# Altium integrated library WE_WR-TBL_Wire Protector System_5.00 mm_rev15e.IntLib: 76 symbols
Pins are listed as number, name and electrical type; pins without a type are passive.

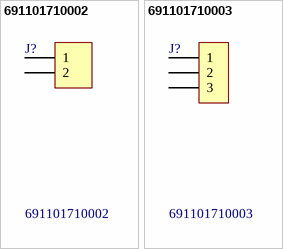
[diagram p0: symbols 691101710002 to 691101710003]

## 691101710002
designator J?
WR-TBL Terminal block - serie 101-5.0mm; Manufacturer: Würth Elektronik eiSos GmbH; ComponentLink1 Description: Manufacturer; ComponentLink2 Description: Datasheet; NoPins: 2; Created Date: 30 October 2013; partNo: 691101710002; ComponentLink1URL: http://www.we-online.com; ComponentLink2URL: http://katalog.we-online.de/em/datasheet/6911017100xx.pdf; Created by: Karrer Zheng
footprint 691101710002 (5,00mm - modular - blue - Horizontal entry with pressure clamp - 12,6mm height - 02p)
pins: 1, 2

## 691101710003
designator J?
WR-TBL Terminal block - serie 101-5.0mm; Manufacturer: Würth Elektronik eiSos GmbH; ComponentLink1 Description: Manufacturer; ComponentLink2 Description: Datasheet; NoPins: 3; Created Date: 30 October 2013; partNo: 691101710003; ComponentLink1URL: http://www.we-online.com; ComponentLink2URL: http://katalog.we-online.de/em/datasheet/6911017100xx.pdf; Created by: Karrer Zheng
footprint 691101710003 (5,00mm - modular - blue - Horizontal entry with pressure clamp - 12,6mm height - 03p)
pins: 1, 2, 3


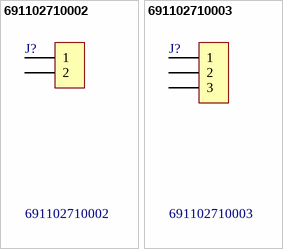
[diagram p1: symbols 691102710002 to 691102710003]

## 691102710002
designator J?
WR-TBL Terminal block - serie 102 - 5.0mm; Manufacturer: Würth Elektronik eiSos GmbH; ComponentLink1 Description: Manufacturer; ComponentLink2 Description: Datasheet; NoPins: 2; Created Date: 31 October 2013; partNo: 691102710002; ComponentLink1URL: http://www.we-online.com; ComponentLink2URL: http://katalog.we-online.de/em/datasheet/6911027100xx.pdf; Created by: Karrer Zheng
footprint 691102710002 (5,00mm - modular - blue - Horizontal entry with pressure clamp - 9,9 mm height - 02p)
pins: 1, 2

## 691102710003
designator J?
WR-TBL Terminal block - serie 102 - 5.0mm; Manufacturer: Würth Elektronik eiSos GmbH; ComponentLink1 Description: Manufacturer; ComponentLink2 Description: Datasheet; NoPins: 3; Created Date: 31 October 2013; partNo: 691102710003; ComponentLink1URL: http://www.we-online.com; ComponentLink2URL: http://katalog.we-online.de/em/datasheet/6911027100xx.pdf; Created by: Karrer Zheng
footprint 691102710003 (5,00mm - modular - blue - Horizontal entry with pressure clamp - 9,9 mm height - 03p)
pins: 1, 2, 3


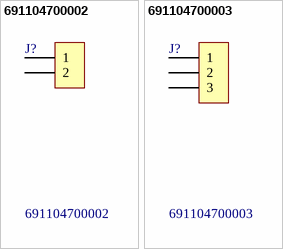
[diagram p2: symbols 691104700002 to 691104700003]

## 691104700002
designator J?
WR-TBL Terminal block - serie 1047 - 5.0mm; Manufacturer: Würth Elektronik eiSos GmbH; ComponentLink1 Description: Manufacturer; ComponentLink2 Description: Datasheet; NoPins: 2; Created Date: 1 Novenber 2013; partNo: 691104700002; ComponentLink1URL: http://www.we-online.com; ComponentLink2URL: http://katalog.we-online.de/em/datasheet/66911047000xx.pdf; Created by: Karrer Zheng
footprint 691104700002 (,00mm - modular - blue - Vertical wire entry - Pressure clamp - 02p)
pins: 1, 2

## 691104700003
designator J?
WR-TBL Terminal block - serie 1047 - 5.0mm; Manufacturer: Würth Elektronik eiSos GmbH; ComponentLink1 Description: Manufacturer; ComponentLink2 Description: Datasheet; NoPins: 3; Created Date: 1 Novenber 2013; partNo: 691104700003; ComponentLink1URL: http://www.we-online.com; ComponentLink2URL: http://katalog.we-online.de/em/datasheet/66911047000xx.pdf; Created by: Karrer Zheng
footprint 691104700003 (,00mm - modular - blue - Vertical wire entry - Pressure clamp - 03p)
pins: 1, 2, 3


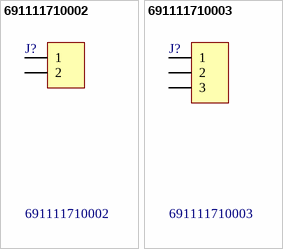
[diagram p3: symbols 691111710002 to 691111710003]

## 691111710002
designator J?
WR-TBL Terminal block - serie 111 - 5.0mm; Manufacturer: Würth Elektronik eiSos GmbH; ComponentLink1 Description: Manufacturer; ComponentLink2 Description: Datasheet; NoPins: 2; Created Date: 6 Novenber 2013; partNo: 691111710002; ComponentLink1URL: http://www.we-online.com; ComponentLink2URL: http://katalog.we-online.de/em/datasheet/6911117100xx.pdf; Created by: Karrer Zheng
footprint 691111710002 (5,00mm - modular - green - Horizontal entry with pressure clamp - 10,0mm height - 02p)
pins: 1, 2

## 691111710003
designator J?
WR-TBL Terminal block - serie 111 - 5.0mm; Manufacturer: Würth Elektronik eiSos GmbH; ComponentLink1 Description: Manufacturer; ComponentLink2 Description: Datasheet; NoPins: 3; Created Date: 6 Novenber 2013; partNo: 691111710003; ComponentLink1URL: http://www.we-online.com; ComponentLink2URL: http://katalog.we-online.de/em/datasheet/6911117100xx.pdf; Created by: Karrer Zheng
footprint 691111710003 (5,00mm - modular - green - Horizontal entry with pressure clamp - 10,0mm height - 03p)
pins: 1, 2, 3


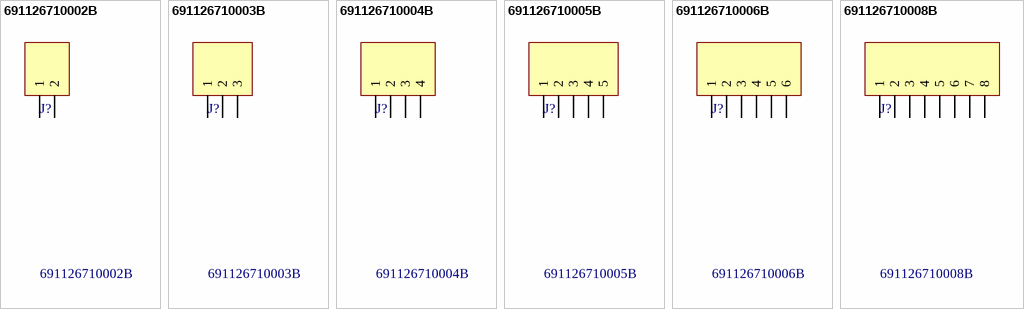
[diagram p4: symbols 691126710002B to 691126710008B]

## 691126710002B
designator J?
WR-TBL Terminal Block - Serie 126B - 5.0mm; Manufacturer: Würth Elektronik eiSos GmbH; ComponentLink1 Description: Manufacturer; ComponentLink2 Description: Datasheet; NoPins: 2; Created Date: 1 Novenber 2013; partNo: 691126710002B; ComponentLink1URL: http://www.we-online.com; ComponentLink2URL: http://katalog.we-online.de/em/datasheet/6911267100xxB.pdf; Created by: Karrer Zheng
footprint 691126710002B (5,00 mm - PCB Horizontal - 02p)
pins: 1, 2

## 691126710003B
designator J?
WR-TBL Terminal Block - Serie 126B - 5.0mm; Manufacturer: Würth Elektronik eiSos GmbH; ComponentLink1 Description: Manufacturer; ComponentLink2 Description: Datasheet; NoPins: 3; Created Date: 1 Novenber 2013; partNo: 691126710003B; ComponentLink1URL: http://www.we-online.com; ComponentLink2URL: http://katalog.we-online.de/em/datasheet/6911267100xxB.pdf; Created by: Karrer Zheng
footprint 691126710003B (5,00 mm - PCB Horizontal - 03p)
pins: 1, 2, 3

## 691126710004B
designator J?
WR-TBL Terminal Block - Serie 126B - 5.0mm; Manufacturer: Würth Elektronik eiSos GmbH; ComponentLink1 Description: Manufacturer; ComponentLink2 Description: Datasheet; NoPins: 4; Created Date: 1 Novenber 2013; partNo: 691126710004B; ComponentLink1URL: http://www.we-online.com; ComponentLink2URL: http://katalog.we-online.de/em/datasheet/6911267100xxB.pdf; Created by: Karrer Zheng
footprint 691126710004B (5,00 mm - PCB Horizontal - 04p)
pins: 1, 2, 3, 4

## 691126710005B
designator J?
WR-TBL Terminal Block - Serie 126B - 5.0mm; Manufacturer: Würth Elektronik eiSos GmbH; ComponentLink1 Description: Manufacturer; ComponentLink2 Description: Datasheet; NoPins: 5; Created Date: 1 Novenber 2013; partNo: 691126710005B; ComponentLink1URL: http://www.we-online.com; ComponentLink2URL: http://katalog.we-online.de/em/datasheet/6911267100xxB.pdf; Created by: Karrer Zheng
footprint 691126710005B (5,00 mm - PCB Horizontal - 05p)
pins: 1, 2, 3, 4, 5

## 691126710006B
designator J?
WR-TBL Terminal Block - Serie 126B - 5.0mm; Manufacturer: Würth Elektronik eiSos GmbH; ComponentLink1 Description: Manufacturer; ComponentLink2 Description: Datasheet; NoPins: 6; Created Date: 1 Novenber 2013; partNo: 691126710006B; ComponentLink1URL: http://www.we-online.com; ComponentLink2URL: http://katalog.we-online.de/em/datasheet/6911267100xxB.pdf; Created by: Karrer Zheng
footprint 691126710006B (5,00 mm - PCB Horizontal - 06p)
pins: 1, 2, 3, 4, 5, 6

## 691126710008B
designator J?
WR-TBL Terminal Block - Serie 126B - 5.0mm; Manufacturer: Würth Elektronik eiSos GmbH; ComponentLink1 Description: Manufacturer; ComponentLink2 Description: Datasheet; NoPins: 8; Created Date: 1 Novenber 2013; partNo: 691126710008B; ComponentLink1URL: http://www.we-online.com; ComponentLink2URL: http://katalog.we-online.de/em/datasheet/6911267100xxB.pdf; Created by: Karrer Zheng
footprint 691126710008B (5,00 mm - PCB Horizontal - 08p)
pins: 1, 2, 3, 4, 5, 6, 7, 8


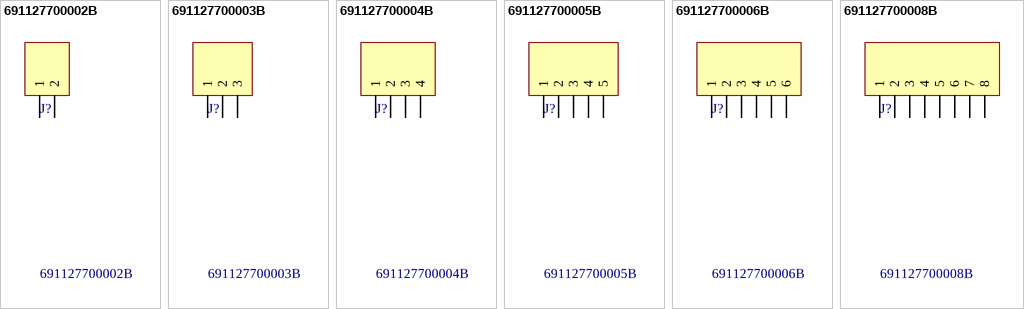
[diagram p5: symbols 691127700002B to 691127700008B]

## 691127700002B
designator J?
WR-TBL Terminal Block - Serie 127B - 5.0mm; Manufacturer: Würth Elektronik eiSos GmbH; ComponentLink1 Description: Manufacturer; ComponentLink2 Description: Datasheet; NoPins: 4; Created Date: 5 Novenber 2013; partNo: 691127700002B; ComponentLink1URL: http://www.we-online.com; ComponentLink2URL: http://katalog.we-online.de/em/datasheet/6911277000xxB.pdf; Created by: Karrer Zheng
footprint 691127700002B (5,00 mm - PCB Vertical - 02p)
pins: 1, 2

## 691127700003B
designator J?
WR-TBL Terminal Block - Serie 127B - 5.0mm; Manufacturer: Würth Elektronik eiSos GmbH; ComponentLink1 Description: Manufacturer; ComponentLink2 Description: Datasheet; NoPins: 6; Created Date: 5 Novenber 2013; partNo: 691127700003B; ComponentLink1URL: http://www.we-online.com; ComponentLink2URL: http://katalog.we-online.de/em/datasheet/6911277000xxB.pdf; Created by: Karrer Zheng
footprint 691127700003B (5,00 mm - PCB Vertical - 03p)
pins: 1, 2, 3

## 691127700004B
designator J?
WR-TBL Terminal Block - Serie 127B - 5.0mm; Manufacturer: Würth Elektronik eiSos GmbH; ComponentLink1 Description: Manufacturer; ComponentLink2 Description: Datasheet; NoPins: 8; Created Date: 5 Novenber 2013; partNo: 691127700004B; ComponentLink1URL: http://www.we-online.com; ComponentLink2URL: http://katalog.we-online.de/em/datasheet/6911277000xxB.pdf; Created by: Karrer Zheng
footprint 691127700004B (5,00 mm - PCB Vertical - 04p)
pins: 1, 2, 3, 4

## 691127700005B
designator J?
WR-TBL Terminal Block - Serie 127B - 5.0mm; Manufacturer: Würth Elektronik eiSos GmbH; ComponentLink1 Description: Manufacturer; ComponentLink2 Description: Datasheet; NoPins: 10; Created Date: 5 Novenber 2013; partNo: 691127700005B; ComponentLink1URL: http://www.we-online.com; ComponentLink2URL: http://katalog.we-online.de/em/datasheet/6911277000xxB.pdf; Created by: Karrer Zheng
footprint 691127700005B (5,00 mm - PCB Vertical - 05p)
pins: 1, 2, 3, 4, 5

## 691127700006B
designator J?
WR-TBL Terminal Block - Serie 127B - 5.0mm; Manufacturer: Würth Elektronik eiSos GmbH; ComponentLink1 Description: Manufacturer; ComponentLink2 Description: Datasheet; NoPins: 12; Created Date: 5 Novenber 2013; partNo: 691127700006B; ComponentLink1URL: http://www.we-online.com; ComponentLink2URL: http://katalog.we-online.de/em/datasheet/6911277000xxB.pdf; Created by: Karrer Zheng
footprint 691127700006B (5,00 mm - PCB Vertical - 06p)
pins: 1, 2, 3, 4, 5, 6

## 691127700008B
designator J?
WR-TBL Terminal Block - Serie 127B - 5.0mm; Manufacturer: Würth Elektronik eiSos GmbH; ComponentLink1 Description: Manufacturer; ComponentLink2 Description: Datasheet; NoPins: 16; Created Date: 5 Novenber 2013; partNo: 691127700008B; ComponentLink1URL: http://www.we-online.com; ComponentLink2URL: http://katalog.we-online.de/em/datasheet/6911277000xxB.pdf; Created by: Karrer Zheng
footprint 691127700008B (5,00 mm - PCB Vertical - 08p)
pins: 1, 2, 3, 4, 5, 6, 7, 8


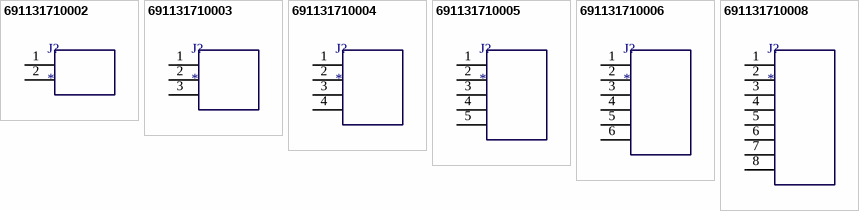
[diagram p6: symbols 691131710002 to 691131710008]

## 691131710002
designator J?
Serie 131 – 5.00 mm with Pressure clamp Divisible; Manufacturer: Würth Elektronik eiSos GmbH; partNo: 691131710002; ComponentLink1 Description: Manufacturer; ComponentLink2 Description: Datasheet; ComponentLink1URL: http://www.we-online.de; ComponentLink2URL: http://katalog.we-online.de/em/datasheet/6911317100xx.pdf; Created by: Karrer Zheng; Created Date: 10/23/2014
footprint 691131710002
pins: 1  , 2  

## 691131710003
designator J?
Serie 131 – 5.00 mm with Pressure clamp Divisible; Manufacturer: Würth Elektronik eiSos GmbH; partNo: 691131710003; ComponentLink1 Description: Manufacturer; ComponentLink2 Description: Datasheet; ComponentLink1URL: http://www.we-online.de; ComponentLink2URL: http://katalog.we-online.de/em/datasheet/6911317100xx.pdf; Created by: Karrer Zheng; Created Date: 10/23/2014
footprint 691131710003
pins: 1  , 2  , 3  

## 691131710004
designator J?
Serie 131 – 5.00 mm with Pressure clamp Divisible; Manufacturer: Würth Elektronik eiSos GmbH; partNo: 691131710004; ComponentLink1 Description: Manufacturer; ComponentLink2 Description: Datasheet; ComponentLink1URL: http://www.we-online.de; ComponentLink2URL: http://katalog.we-online.de/em/datasheet/6911317100xx.pdf; Created by: Karrer Zheng; Created Date: 10/23/2014
footprint 691131710004
pins: 1  , 2  , 3  , 4  

## 691131710005
designator J?
Serie 131 – 5.00 mm with Pressure clamp Divisible; Manufacturer: Würth Elektronik eiSos GmbH; partNo: 691131710005; ComponentLink1 Description: Manufacturer; ComponentLink2 Description: Datasheet; ComponentLink1URL: http://www.we-online.de; ComponentLink2URL: http://katalog.we-online.de/em/datasheet/6911317100xx.pdf; Created by: Karrer Zheng; Created Date: 10/23/2014
footprint 691131710005
pins: 1  , 2  , 3  , 4  , 5  

## 691131710006
designator J?
Serie 131 – 5.00 mm with Pressure clamp Divisible; Manufacturer: Würth Elektronik eiSos GmbH; partNo: 691131710006; ComponentLink1 Description: Manufacturer; ComponentLink2 Description: Datasheet; ComponentLink1URL: http://www.we-online.de; ComponentLink2URL: http://katalog.we-online.de/em/datasheet/6911317100xx.pdf; Created by: Karrer Zheng; Created Date: 10/23/2014
footprint 691131710006
pins: 1  , 2  , 3  , 4  , 5  , 6  

## 691131710008
designator J?
Serie 131 – 5.00 mm with Pressure clamp Divisible; Manufacturer: Würth Elektronik eiSos GmbH; partNo: 691131710008; ComponentLink1 Description: Manufacturer; ComponentLink2 Description: Datasheet; ComponentLink1URL: http://www.we-online.de; ComponentLink2URL: http://katalog.we-online.de/em/datasheet/6911317100xx.pdf; Created by: Karrer Zheng; Created Date: 10/23/2014
footprint 691131710008
pins: 1  , 2  , 3  , 4  , 5  , 6  , 7  , 8  


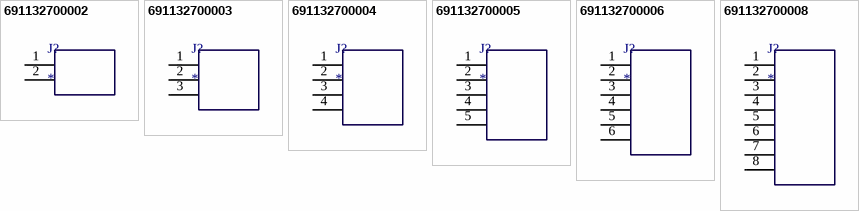
[diagram p7: symbols 691132700002 to 691132700008]

## 691132700002
designator J?
Serie 132 – 5.00 mm with Pressure Clamp Divisible; Manufacturer: Würth Elektronik eiSos GmbH; partNo: 691132700002; ComponentLink1 Description: Manufacturer; ComponentLink2 Description: Datasheet; ComponentLink1URL: http://www.we-online.de; ComponentLink2URL: http://katalog.we-online.de/em/datasheet/6911327000xx.pdf; Created by: Karrer Zheng; Created Date: 10/23/2014
footprint 691132700002
pins: 1  , 2  

## 691132700003
designator J?
Serie 132 – 5.00 mm with Pressure Clamp Divisible; Manufacturer: Würth Elektronik eiSos GmbH; partNo: 691132700003; ComponentLink1 Description: Manufacturer; ComponentLink2 Description: Datasheet; ComponentLink1URL: http://www.we-online.de; ComponentLink2URL: http://katalog.we-online.de/em/datasheet/6911327000xx.pdf; Created by: Karrer Zheng; Created Date: 10/23/2014
footprint 691132700003
pins: 1  , 2  , 3  

## 691132700004
designator J?
Serie 132 – 5.00 mm with Pressure Clamp Divisible; Manufacturer: Würth Elektronik eiSos GmbH; partNo: 691132700004; ComponentLink1 Description: Manufacturer; ComponentLink2 Description: Datasheet; ComponentLink1URL: http://www.we-online.de; ComponentLink2URL: http://katalog.we-online.de/em/datasheet/6911327000xx.pdf; Created by: Karrer Zheng; Created Date: 10/23/2014
footprint 691132700004
pins: 1  , 2  , 3  , 4  

## 691132700005
designator J?
Serie 132 – 5.00 mm with Pressure Clamp Divisible; Manufacturer: Würth Elektronik eiSos GmbH; partNo: 691132700005; ComponentLink1 Description: Manufacturer; ComponentLink2 Description: Datasheet; ComponentLink1URL: http://www.we-online.de; ComponentLink2URL: http://katalog.we-online.de/em/datasheet/6911327000xx.pdf; Created by: Karrer Zheng; Created Date: 10/23/2014
footprint 691132700005
pins: 1  , 2  , 3  , 4  , 5  

## 691132700006
designator J?
Serie 132 – 5.00 mm with Pressure Clamp Divisible; Manufacturer: Würth Elektronik eiSos GmbH; partNo: 691132700006; ComponentLink1 Description: Manufacturer; ComponentLink2 Description: Datasheet; ComponentLink1URL: http://www.we-online.de; ComponentLink2URL: http://katalog.we-online.de/em/datasheet/6911327000xx.pdf; Created by: Karrer Zheng; Created Date: 10/23/2014
footprint 691132700006
pins: 1  , 2  , 3  , 4  , 5  , 6  

## 691132700008
designator J?
Serie 132 – 5.00 mm with Pressure Clamp Divisible; Manufacturer: Würth Elektronik eiSos GmbH; partNo: 691132700008; ComponentLink1 Description: Manufacturer; ComponentLink2 Description: Datasheet; ComponentLink1URL: http://www.we-online.de; ComponentLink2URL: http://katalog.we-online.de/em/datasheet/6911327000xx.pdf; Created by: Karrer Zheng; Created Date: 10/23/2014
footprint 691132700008
pins: 1  , 2  , 3  , 4  , 5  , 6  , 7  , 8  


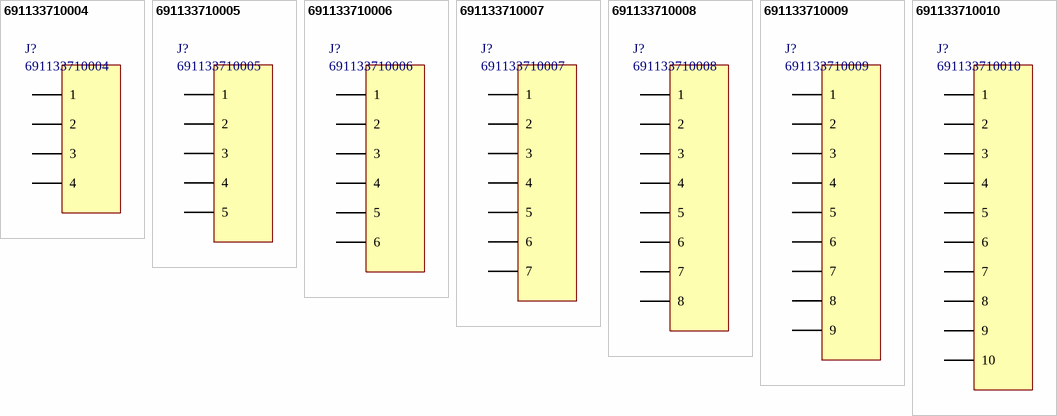
[diagram p8: symbols 691133710004 to 691133710010]

## 691133710004
designator J?
Horizontal Cable Entry with Pressure Clamp, Serie 1337 - 5.00 mm; Manufacturer: Würth Elektronik eiSos GmbH; ComponentLink1 Description: Manufacturer; ComponentLink2 Description: Datasheet; NoPins: 4; ComponentLink1 URL: http://www.we-online.com; ComponentLink2 URL: http://katalog.we-online.de/em/datasheet/6911337100xx.pdf; Created By: Baojun Chen; Created Date: 4-Aug-15; PartNo: 691133710004
footprint 691133710004 (Serie 1337 - 5.00 mm_4 pins)
pins: 1, 2, 3, 4

## 691133710005
designator J?
Horizontal Cable Entry with Pressure Clamp, Serie 1337 - 5.00 mm; Manufacturer: Würth Elektronik eiSos GmbH; ComponentLink1 Description: Manufacturer; ComponentLink2 Description: Datasheet; NoPins: 5; ComponentLink1 URL: http://www.we-online.com; ComponentLink2 URL: http://katalog.we-online.de/em/datasheet/6911337100xx.pdf; Created By: Baojun Chen; Created Date: 4-Aug-15; PartNo: 691133710005
footprint 691133710005 (Serie 1337 - 5.00 mm_5 pins)
pins: 1, 2, 3, 4, 5

## 691133710006
designator J?
Horizontal Cable Entry with Pressure Clamp, Serie 1337 - 5.00 mm; Manufacturer: Würth Elektronik eiSos GmbH; ComponentLink1 Description: Manufacturer; ComponentLink2 Description: Datasheet; NoPins: 6; ComponentLink1 URL: http://www.we-online.com; ComponentLink2 URL: http://katalog.we-online.de/em/datasheet/6911337100xx.pdf; Created By: Baojun Chen; Created Date: 4-Aug-15; PartNo: 691133710006
footprint 691133710006 (Serie 1337 - 5.00 mm_6 pins)
pins: 1, 2, 3, 4, 5, 6

## 691133710007
designator J?
Horizontal Cable Entry with Pressure Clamp, Serie 1337 - 5.00 mm; Manufacturer: Würth Elektronik eiSos GmbH; ComponentLink1 Description: Manufacturer; ComponentLink2 Description: Datasheet; NoPins: 7; ComponentLink1 URL: http://www.we-online.com; ComponentLink2 URL: http://katalog.we-online.de/em/datasheet/6911337100xx.pdf; Created By: Baojun Chen; Created Date: 4-Aug-15; PartNo: 691133710007
footprint 691133710007 (Serie 1337 - 5.00 mm_7 pins)
pins: 1, 2, 3, 4, 5, 6, 7

## 691133710008
designator J?
Horizontal Cable Entry with Pressure Clamp, Serie 1337 - 5.00 mm; Manufacturer: Würth Elektronik eiSos GmbH; ComponentLink1 Description: Manufacturer; ComponentLink2 Description: Datasheet; NoPins: 8; ComponentLink1 URL: http://www.we-online.com; ComponentLink2 URL: http://katalog.we-online.de/em/datasheet/6911337100xx.pdf; Created By: Baojun Chen; Created Date: 4-Aug-15; PartNo: 691133710008
footprint 691133710008 (Serie 1337 - 5.00 mm_8 pins)
pins: 1, 2, 3, 4, 5, 6, 7, 8

## 691133710009
designator J?
Horizontal Cable Entry with Pressure Clamp, Serie 1337 - 5.00 mm; Manufacturer: Würth Elektronik eiSos GmbH; ComponentLink1 Description: Manufacturer; ComponentLink2 Description: Datasheet; NoPins: 9; ComponentLink1 URL: http://www.we-online.com; ComponentLink2 URL: http://katalog.we-online.de/em/datasheet/6911337100xx.pdf; Created By: Baojun Chen; Created Date: 4-Aug-15; PartNo: 691133710009
footprint 691133710009 (Serie 1337 - 5.00 mm_9 pins)
pins: 1, 2, 3, 4, 5, 6, 7, 8, 9

## 691133710010
designator J?
Horizontal Cable Entry with Pressure Clamp, Serie 1337 - 5.00 mm; Manufacturer: Würth Elektronik eiSos GmbH; ComponentLink1 Description: Manufacturer; ComponentLink2 Description: Datasheet; NoPins: 10; ComponentLink1 URL: http://www.we-online.com; ComponentLink2 URL: http://katalog.we-online.de/em/datasheet/6911337100xx.pdf; Created By: Baojun Chen; Created Date: 4-Aug-15; PartNo: 691133710010
footprint 691133710010 (Serie 1337 - 5.00 mm_10 pins)
pins: 1, 2, 3, 4, 5, 6, 7, 8, 9, 10


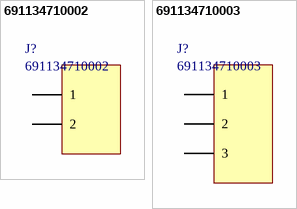
[diagram p9: symbols 691134710002 to 691134710003]

## 691134710002
designator J?
Horizontal Cable Entry with Pressure Clamp, Serie 1347 - 5.00 mm; Manufacturer: Wurth Elektronik; ComponentLink1 Description: Manufacturer; ComponentLink2 Description: Datasheet; NoPins: 2; ComponentLink1 URL: http://www.we-online.com; ComponentLink2 URL: http://katalog.we-online.de/em/datasheet/6911347100xx.pdf; Created By: Baojun Chen; Created Date: 4-Aug-15; PartNo: 691134710002
footprint 691134710002 (Serie 1347 - 5.00 mm_2 pins)
pins: 1, 2

## 691134710003
designator J?
Horizontal Cable Entry with Pressure Clamp, Serie 1347 - 5.00 mm; Manufacturer: Wurth Elektronik; ComponentLink1 Description: Manufacturer; ComponentLink2 Description: Datasheet; NoPins: 3; ComponentLink1 URL: http://www.we-online.com; ComponentLink2 URL: http://katalog.we-online.de/em/datasheet/6911347100xx.pdf; Created By: Baojun Chen; Created Date: 4-Aug-15; PartNo: 691134710003
footprint 691134710003 (Serie 1347 - 5.00 mm_3 pins)
pins: 1, 2, 3


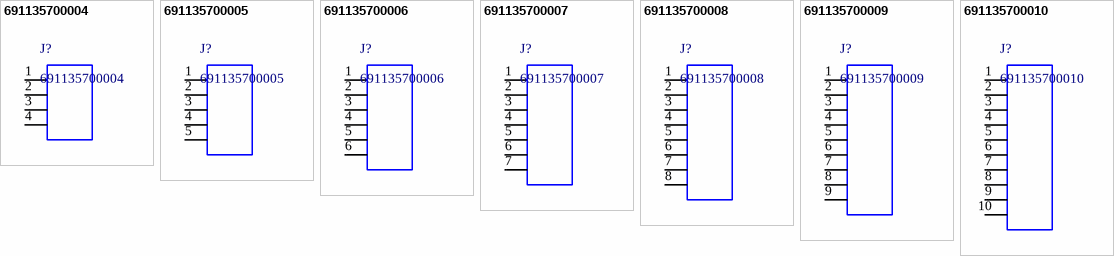
[diagram p10: symbols 691135700004 to 691135700010]

## 691135700004
designator J?
WR-TBL Terminal Blocks - Serie 1357; Manufacturer: Wurth Elektronik; ComponentLink1 Description: Manufacturer; ComponentLink2 Description: Datasheet; ComponentLink1URL: http://www.we-online.de; ComponentLink2URL: http://katalog.we-online.de/em/datasheet/6911357000XX.pdf; Created by: Baojun Chen; Created Date: 15.Sep.2015; partNo: 691135700004
footprint 691135700004 (Serie 1357 - 5.00 mm _ 4 pins)
pins: 1, 2, 3, 4

## 691135700005
designator J?
WR-TBL Terminal Blocks - Serie 1357; Manufacturer: Wurth Elektronik; ComponentLink1 Description: Manufacturer; ComponentLink2 Description: Datasheet; ComponentLink1URL: http://www.we-online.de; ComponentLink2URL: http://katalog.we-online.de/em/datasheet/6911357000XX.pdf; Created by: Baojun Chen; Created Date: 15.Sep.2015; partNo: 691135700005
footprint 691135700005 (Serie 1357 - 5.00 mm _ 5 pins)
pins: 1, 2, 3, 4, 5

## 691135700006
designator J?
WR-TBL Terminal Blocks - Serie 1357; Manufacturer: Wurth Elektronik; ComponentLink1 Description: Manufacturer; ComponentLink2 Description: Datasheet; ComponentLink1URL: http://www.we-online.de; ComponentLink2URL: http://katalog.we-online.de/em/datasheet/6911357000XX.pdf; Created by: Baojun Chen; Created Date: 15.Sep.2015; partNo: 691135700006
footprint 691135700006 (Serie 1357 - 5.00 mm _ 6 pins)
pins: 1, 2, 3, 4, 5, 6

## 691135700007
designator J?
WR-TBL Terminal Blocks - Serie 1357; Manufacturer: Wurth Elektronik; ComponentLink1 Description: Manufacturer; ComponentLink2 Description: Datasheet; ComponentLink1URL: http://www.we-online.de; ComponentLink2URL: http://katalog.we-online.de/em/datasheet/6911357000XX.pdf; Created by: Baojun Chen; Created Date: 15.Sep.2015; partNo: 691135700007
footprint 691135700007 (Serie 1357 - 5.00 mm _ 7 pins)
pins: 1, 2, 3, 4, 5, 6, 7

## 691135700008
designator J?
WR-TBL Terminal Blocks - Serie 1357; Manufacturer: Wurth Elektronik; ComponentLink1 Description: Manufacturer; ComponentLink2 Description: Datasheet; ComponentLink1URL: http://www.we-online.de; ComponentLink2URL: http://katalog.we-online.de/em/datasheet/6911357000XX.pdf; Created by: Baojun Chen; Created Date: 15.Sep.2015; partNo: 691135700008
footprint 691135700008 (Serie 1357 - 5.00 mm _ 8 pins)
pins: 1, 2, 3, 4, 5, 6, 7, 8

## 691135700009
designator J?
WR-TBL Terminal Blocks - Serie 1357; Manufacturer: Wurth Elektronik; ComponentLink1 Description: Manufacturer; ComponentLink2 Description: Datasheet; ComponentLink1URL: http://www.we-online.de; ComponentLink2URL: http://katalog.we-online.de/em/datasheet/6911357000XX.pdf; Created by: Baojun Chen; Created Date: 15.Sep.2015; partNo: 691135700009
footprint 691135700009 (Serie 1357 - 5.00 mm _ 9 pins)
pins: 1, 2, 3, 4, 5, 6, 7, 8, 9

## 691135700010
designator J?
WR-TBL Terminal Blocks - Serie 1357; Manufacturer: Wurth Elektronik; ComponentLink1 Description: Manufacturer; ComponentLink2 Description: Datasheet; ComponentLink1URL: http://www.we-online.de; ComponentLink2URL: http://katalog.we-online.de/em/datasheet/6911357000XX.pdf; Created by: Baojun Chen; Created Date: 15.Sep.2015; partNo: 691135700010
footprint 691135700010 (Serie 1357 - 5.00 mm _ 10 pins)
pins: 1, 2, 3, 4, 5, 6, 7, 8, 9, 10


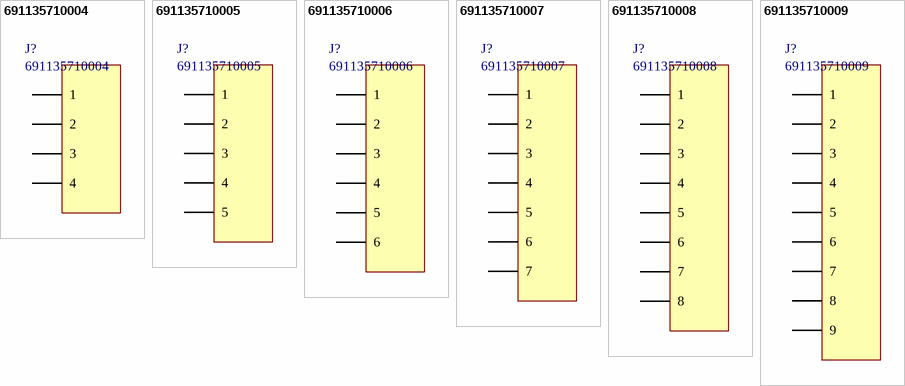
[diagram p11: symbols 691135710004 to 691135710009]

## 691135710004
designator J?
Horizontal Cable Entry with Pressure Clamp, Serie 1357 - 5.00 mm; Manufacturer: Wurth Elektronik; ComponentLink1 Description: Manufacturer; ComponentLink2 Description: Datasheet; NoPins: 4; ComponentLink1 URL: http://www.we-online.com; ComponentLink2 URL: http://katalog.we-online.de/em/datasheet/6911357100xx.pdf; Created By: Baojun Chen; Created Date: 5-Aug-15; PartNo: 691135710004
footprint 691135710004 (Serie 1357 - 5.00 mm_4 pins)
pins: 1, 2, 3, 4

## 691135710005
designator J?
Horizontal Cable Entry with Pressure Clamp, Serie 1357 - 5.00 mm; Manufacturer: Wurth Elektronik; ComponentLink1 Description: Manufacturer; ComponentLink2 Description: Datasheet; NoPins: 5; ComponentLink1 URL: http://www.we-online.com; ComponentLink2 URL: http://katalog.we-online.de/em/datasheet/6911357100xx.pdf; Created By: Baojun Chen; Created Date: 5-Aug-15; PartNo: 691135710005
footprint 691135710005 (Serie 1357 - 5.00 mm_5 pins)
pins: 1, 2, 3, 4, 5

## 691135710006
designator J?
Horizontal Cable Entry with Pressure Clamp, Serie 1357 - 5.00 mm; Manufacturer: Wurth Elektronik; ComponentLink1 Description: Manufacturer; ComponentLink2 Description: Datasheet; NoPins: 6; ComponentLink1 URL: http://www.we-online.com; ComponentLink2 URL: http://katalog.we-online.de/em/datasheet/6911357100xx.pdf; Created By: Baojun Chen; Created Date: 5-Aug-15; PartNo: 691135710006
footprint 691135710006 (Serie 1357 - 5.00 mm_6 pins)
pins: 1, 2, 3, 4, 5, 6

## 691135710007
designator J?
Horizontal Cable Entry with Pressure Clamp, Serie 1357 - 5.00 mm; Manufacturer: Wurth Elektronik; ComponentLink1 Description: Manufacturer; ComponentLink2 Description: Datasheet; NoPins: 7; ComponentLink1 URL: http://www.we-online.com; ComponentLink2 URL: http://katalog.we-online.de/em/datasheet/6911357100xx.pdf; Created By: Baojun Chen; Created Date: 5-Aug-15; PartNo: 691135710007
footprint 691135710007 (Serie 1357 - 5.00 mm_7 pins)
pins: 1, 2, 3, 4, 5, 6, 7

## 691135710008
designator J?
Horizontal Cable Entry with Pressure Clamp, Serie 1357 - 5.00 mm; Manufacturer: Wurth Elektronik; ComponentLink1 Description: Manufacturer; ComponentLink2 Description: Datasheet; NoPins: 8; ComponentLink1 URL: http://www.we-online.com; ComponentLink2 URL: http://katalog.we-online.de/em/datasheet/6911357100xx.pdf; Created By: Baojun Chen; Created Date: 5-Aug-15; PartNo: 691135710008
footprint 691135710008 (Serie 1357 - 5.00 mm_8 pins)
pins: 1, 2, 3, 4, 5, 6, 7, 8

## 691135710009
designator J?
Horizontal Cable Entry with Pressure Clamp, Serie 1357 - 5.00 mm; Manufacturer: Wurth Elektronik; ComponentLink1 Description: Manufacturer; ComponentLink2 Description: Datasheet; NoPins: 9; ComponentLink1 URL: http://www.we-online.com; ComponentLink2 URL: http://katalog.we-online.de/em/datasheet/6911357100xx.pdf; Created By: Baojun Chen; Created Date: 5-Aug-15; PartNo: 691135710009
footprint 691135710009 (Serie 1357 - 5.00 mm_9 pins)
pins: 1, 2, 3, 4, 5, 6, 7, 8, 9


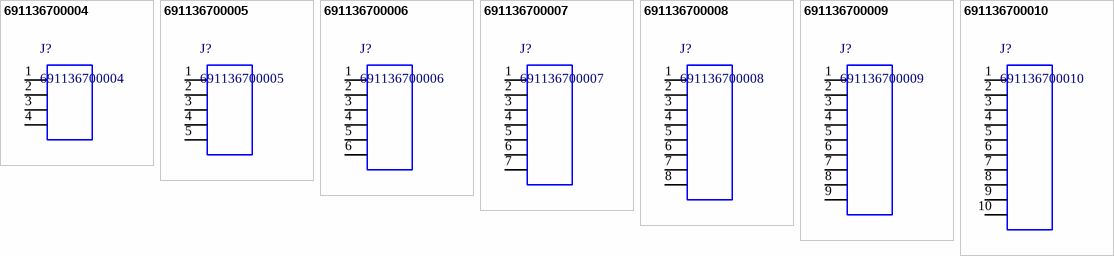
[diagram p12: symbols 691136700004 to 691136700010]

## 691136700004
designator J?
WR-TBL Terminal Blocks - Serie 1367; Manufacturer: Wurth Elektronik; ComponentLink1 Description: Manufacturer; ComponentLink2 Description: Datasheet; ComponentLink1URL: http://www.we-online.de; ComponentLink2URL: http://katalog.we-online.de/em/datasheet/6911367000XX.pdf; Created by: Baojun Chen; Created Date: 15.Sep.2015; partNo: 691136700004
footprint 691136700004 (Serie 1367 - 5.00 mm _ 4 pins)
pins: 1, 2, 3, 4

## 691136700005
designator J?
WR-TBL Terminal Blocks - Serie 1367; Manufacturer: Wurth Elektronik; ComponentLink1 Description: Manufacturer; ComponentLink2 Description: Datasheet; ComponentLink1URL: http://www.we-online.de; ComponentLink2URL: http://katalog.we-online.de/em/datasheet/6911367000XX.pdf; Created by: Baojun Chen; Created Date: 15.Sep.2015; partNo: 691136700005
footprint 691136700005 (Serie 1367 - 5.00 mm _ 5 pins)
pins: 1, 2, 3, 4, 5

## 691136700006
designator J?
WR-TBL Terminal Blocks - Serie 1367; Manufacturer: Wurth Elektronik; ComponentLink1 Description: Manufacturer; ComponentLink2 Description: Datasheet; ComponentLink1URL: http://www.we-online.de; ComponentLink2URL: http://katalog.we-online.de/em/datasheet/6911367000XX.pdf; Created by: Baojun Chen; Created Date: 15.Sep.2015; partNo: 691136700006
footprint 691136700006 (Serie 1367 - 5.00 mm _ 6 pins)
pins: 1, 2, 3, 4, 5, 6

## 691136700007
designator J?
WR-TBL Terminal Blocks - Serie 1367; Manufacturer: Wurth Elektronik; ComponentLink1 Description: Manufacturer; ComponentLink2 Description: Datasheet; ComponentLink1URL: http://www.we-online.de; ComponentLink2URL: http://katalog.we-online.de/em/datasheet/6911367000XX.pdf; Created by: Baojun Chen; Created Date: 15.Sep.2015; partNo: 691136700007
footprint 691136700007 (Serie 1367 - 5.00 mm _ 7 pins)
pins: 1, 2, 3, 4, 5, 6, 7

## 691136700008
designator J?
WR-TBL Terminal Blocks - Serie 1367; Manufacturer: Wurth Elektronik; ComponentLink1 Description: Manufacturer; ComponentLink2 Description: Datasheet; ComponentLink1URL: http://www.we-online.de; ComponentLink2URL: http://katalog.we-online.de/em/datasheet/6911367000XX.pdf; Created by: Baojun Chen; Created Date: 15.Sep.2015; partNo: 691136700008
footprint 691136700008 (Serie 1367 - 5.00 mm _ 8 pins)
pins: 1, 2, 3, 4, 5, 6, 7, 8

## 691136700009
designator J?
WR-TBL Terminal Blocks - Serie 1367; Manufacturer: Wurth Elektronik; ComponentLink1 Description: Manufacturer; ComponentLink2 Description: Datasheet; ComponentLink1URL: http://www.we-online.de; ComponentLink2URL: http://katalog.we-online.de/em/datasheet/6911367000XX.pdf; Created by: Baojun Chen; Created Date: 15.Sep.2015; partNo: 691136700009
footprint 691136700009 (Serie 1367 - 5.00 mm _ 9 pins)
pins: 1, 2, 3, 4, 5, 6, 7, 8, 9

## 691136700010
designator J?
WR-TBL Terminal Blocks - Serie 1367; Manufacturer: Wurth Elektronik; ComponentLink1 Description: Manufacturer; ComponentLink2 Description: Datasheet; ComponentLink1URL: http://www.we-online.de; ComponentLink2URL: http://katalog.we-online.de/em/datasheet/6911367000XX.pdf; Created by: Baojun Chen; Created Date: 15.Sep.2015; partNo: 691136700010
footprint 691136700010 (Serie 1367 - 5.00 mm _ 10 pins)
pins: 1, 2, 3, 4, 5, 6, 7, 8, 9, 10


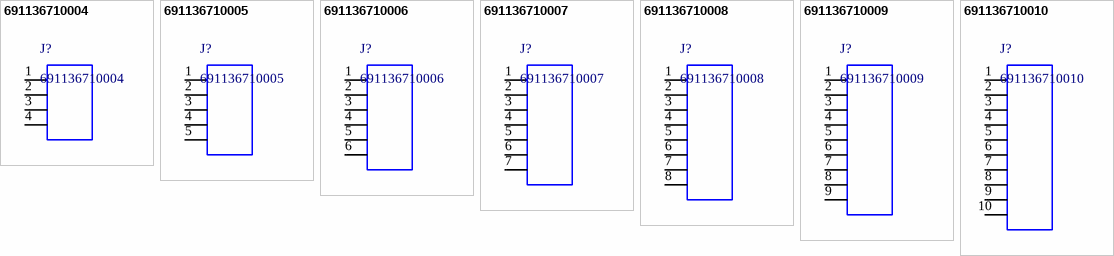
[diagram p13: symbols 691136710004 to 691136710010]

## 691136710004
designator J?
WR-TBL Terminal Blocks - Serie 1367; Manufacturer: Wurth Elektronik; ComponentLink1 Description: Manufacturer; ComponentLink2 Description: Datasheet; ComponentLink1URL: http://www.we-online.de; ComponentLink2URL: http://katalog.we-online.de/em/datasheet/6911367100XX.pdf; Created by: Baojun Chen; Created Date: 16.Sep.2015; partNo: 691136710004
footprint 691136710004 (Serie 1367 - 5.00 mm _ 4 pins)
pins: 1, 2, 3, 4

## 691136710005
designator J?
WR-TBL Terminal Blocks - Serie 1367; Manufacturer: Wurth Elektronik; ComponentLink1 Description: Manufacturer; ComponentLink2 Description: Datasheet; ComponentLink1URL: http://www.we-online.de; ComponentLink2URL: http://katalog.we-online.de/em/datasheet/6911367100XX.pdf; Created by: Baojun Chen; Created Date: 16.Sep.2015; partNo: 691136710005
footprint 691136710005 (Serie 1367 - 5.00 mm _ 5 pins)
pins: 1, 2, 3, 4, 5

## 691136710006
designator J?
WR-TBL Terminal Blocks - Serie 1367; Manufacturer: Wurth Elektronik; ComponentLink1 Description: Manufacturer; ComponentLink2 Description: Datasheet; ComponentLink1URL: http://www.we-online.de; ComponentLink2URL: http://katalog.we-online.de/em/datasheet/6911367100XX.pdf; Created by: Baojun Chen; Created Date: 16.Sep.2015; partNo: 691136710006
footprint 691136710006 (Serie 1367 - 5.00 mm _ 6 pins)
pins: 1, 2, 3, 4, 5, 6

## 691136710007
designator J?
WR-TBL Terminal Blocks - Serie 1367; Manufacturer: Wurth Elektronik; ComponentLink1 Description: Manufacturer; ComponentLink2 Description: Datasheet; ComponentLink1URL: http://www.we-online.de; ComponentLink2URL: http://katalog.we-online.de/em/datasheet/6911367100XX.pdf; Created by: Baojun Chen; Created Date: 16.Sep.2015; partNo: 691136710007
footprint 691136710007 (Serie 1367 - 5.00 mm _ 7 pins)
pins: 1, 2, 3, 4, 5, 6, 7

## 691136710008
designator J?
WR-TBL Terminal Blocks - Serie 1367; Manufacturer: Wurth Elektronik; ComponentLink1 Description: Manufacturer; ComponentLink2 Description: Datasheet; ComponentLink1URL: http://www.we-online.de; ComponentLink2URL: http://katalog.we-online.de/em/datasheet/6911367100XX.pdf; Created by: Baojun Chen; Created Date: 16.Sep.2015; partNo: 691136710008
footprint 691136710008 (Serie 1367 - 5.00 mm _ 8 pins)
pins: 1, 2, 3, 4, 5, 6, 7, 8

## 691136710009
designator J?
WR-TBL Terminal Blocks - Serie 1367; Manufacturer: Wurth Elektronik; ComponentLink1 Description: Manufacturer; ComponentLink2 Description: Datasheet; ComponentLink1URL: http://www.we-online.de; ComponentLink2URL: http://katalog.we-online.de/em/datasheet/6911367100XX.pdf; Created by: Baojun Chen; Created Date: 16.Sep.2015; partNo: 691136710009
footprint 691136710009 (Serie 1367 - 5.00 mm _ 9 pins)
pins: 1, 2, 3, 4, 5, 6, 7, 8, 9

## 691136710010
designator J?
WR-TBL Terminal Blocks - Serie 1367; Manufacturer: Wurth Elektronik; ComponentLink1 Description: Manufacturer; ComponentLink2 Description: Datasheet; ComponentLink1URL: http://www.we-online.de; ComponentLink2URL: http://katalog.we-online.de/em/datasheet/6911367100XX.pdf; Created by: Baojun Chen; Created Date: 16.Sep.2015; partNo: 691136710010
footprint 691136710010 (Serie 1367 - 5.00 mm _ 10 pins)
pins: 1, 2, 3, 4, 5, 6, 7, 8, 9, 10


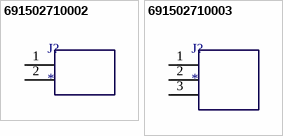
[diagram p14: symbols 691502710002 to 691502710003]

## 691502710002
designator J?
WR-TBL Terminal block - serie 5027; Manufacturer: Würth Elektronik eiSos GmbH; partNo: 691502710002; ComponentLink1 Description: Manufacturer; ComponentLink2 Description: Datasheet; ComponentLink1URL: http://www.we-online.de; ComponentLink2URL: http://katalog.we-online.de/em/datasheet/6915027100xx.pdf; Created by: Karrer Zheng; Created Date: 11/10/2014
footprint 691502710002
pins: 1  , 2  

## 691502710003
designator J?
WR-TBL Terminal block - serie 5027; Manufacturer: Würth Elektronik eiSos GmbH; partNo: 691502710003; ComponentLink1 Description: Manufacturer; ComponentLink2 Description: Datasheet; ComponentLink1URL: http://www.we-online.de; ComponentLink2URL: http://katalog.we-online.de/em/datasheet/6915027100xx.pdf; Created by: Karrer Zheng; Created Date: 11/10/2014
footprint 691502710003
pins: 1  , 2  , 3  


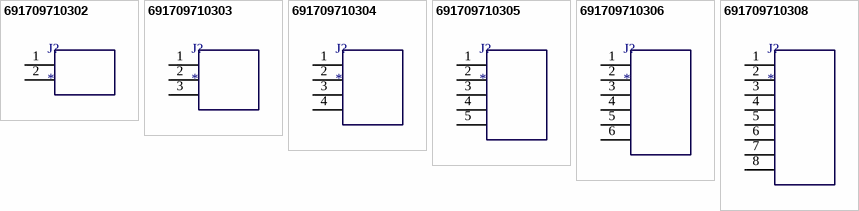
[diagram p15: symbols 691709710302 to 691709710308]

## 691709710302
designator J?
WR-TBL Terminal block - serie 7097; Manufacturer: Würth Elektronik eiSos GmbH; partNo: 691709710302; ComponentLink1 Description: Manufacturer; ComponentLink2 Description: Datasheet; ComponentLink1URL: http://www.we-online.de; ComponentLink2URL: http://katalog.we-online.de/em/datasheet/6917097103xx.pdf; Created by: Karrer Zheng; Created Date: 11/10/2014
footprint 691709710302
pins: 1  , 2  

## 691709710303
designator J?
WR-TBL Terminal block - serie 7097; Manufacturer: Würth Elektronik eiSos GmbH; partNo: 691709710303; ComponentLink1 Description: Manufacturer; ComponentLink2 Description: Datasheet; ComponentLink1URL: http://www.we-online.de; ComponentLink2URL: http://katalog.we-online.de/em/datasheet/6917097103xx.pdf; Created by: Karrer Zheng; Created Date: 11/10/2014
footprint 691709710303
pins: 1  , 2  , 3  

## 691709710304
designator J?
WR-TBL Terminal block - serie 7097; Manufacturer: Würth Elektronik eiSos GmbH; partNo: 691709710304; ComponentLink1 Description: Manufacturer; ComponentLink2 Description: Datasheet; ComponentLink1URL: http://www.we-online.de; ComponentLink2URL: http://katalog.we-online.de/em/datasheet/6917097103xx.pdf; Created by: Karrer Zheng; Created Date: 11/10/2014
footprint 691709710304
pins: 1  , 2  , 3  , 4  

## 691709710305
designator J?
WR-TBL Terminal block - serie 7097; Manufacturer: Würth Elektronik eiSos GmbH; partNo: 691709710305; ComponentLink1 Description: Manufacturer; ComponentLink2 Description: Datasheet; ComponentLink1URL: http://www.we-online.de; ComponentLink2URL: http://katalog.we-online.de/em/datasheet/6917097103xx.pdf; Created by: Karrer Zheng; Created Date: 11/10/2014
footprint 691709710305
pins: 1  , 2  , 3  , 4  , 5  

## 691709710306
designator J?
WR-TBL Terminal block - serie 7097; Manufacturer: Würth Elektronik eiSos GmbH; partNo: 691709710306; ComponentLink1 Description: Manufacturer; ComponentLink2 Description: Datasheet; ComponentLink1URL: http://www.we-online.de; ComponentLink2URL: http://katalog.we-online.de/em/datasheet/6917097103xx.pdf; Created by: Karrer Zheng; Created Date: 11/10/2014
footprint 691709710306
pins: 1  , 2  , 3  , 4  , 5  , 6  

## 691709710308
designator J?
WR-TBL Terminal block - serie 7097; Manufacturer: Würth Elektronik eiSos GmbH; partNo: 691709710308; ComponentLink1 Description: Manufacturer; ComponentLink2 Description: Datasheet; ComponentLink1URL: http://www.we-online.de; ComponentLink2URL: http://katalog.we-online.de/em/datasheet/6917097103xx.pdf; Created by: Karrer Zheng; Created Date: 11/10/2014
footprint 691709710308
pins: 1  , 2  , 3  , 4  , 5  , 6  , 7  , 8  